# Altium footprint library SMT.PcbLib: 379 footprints (part 20 of 24)
Each footprint in its own frame and in the unit in brackets; x right, y up, seen from the top. Pads: shape width x height; smd on the part's side, far side on the other; paste and mask are expansions set on the pad; w line width, h text height; cw(c..) or ccw(c..) is an arc to the next point about the centre after c.
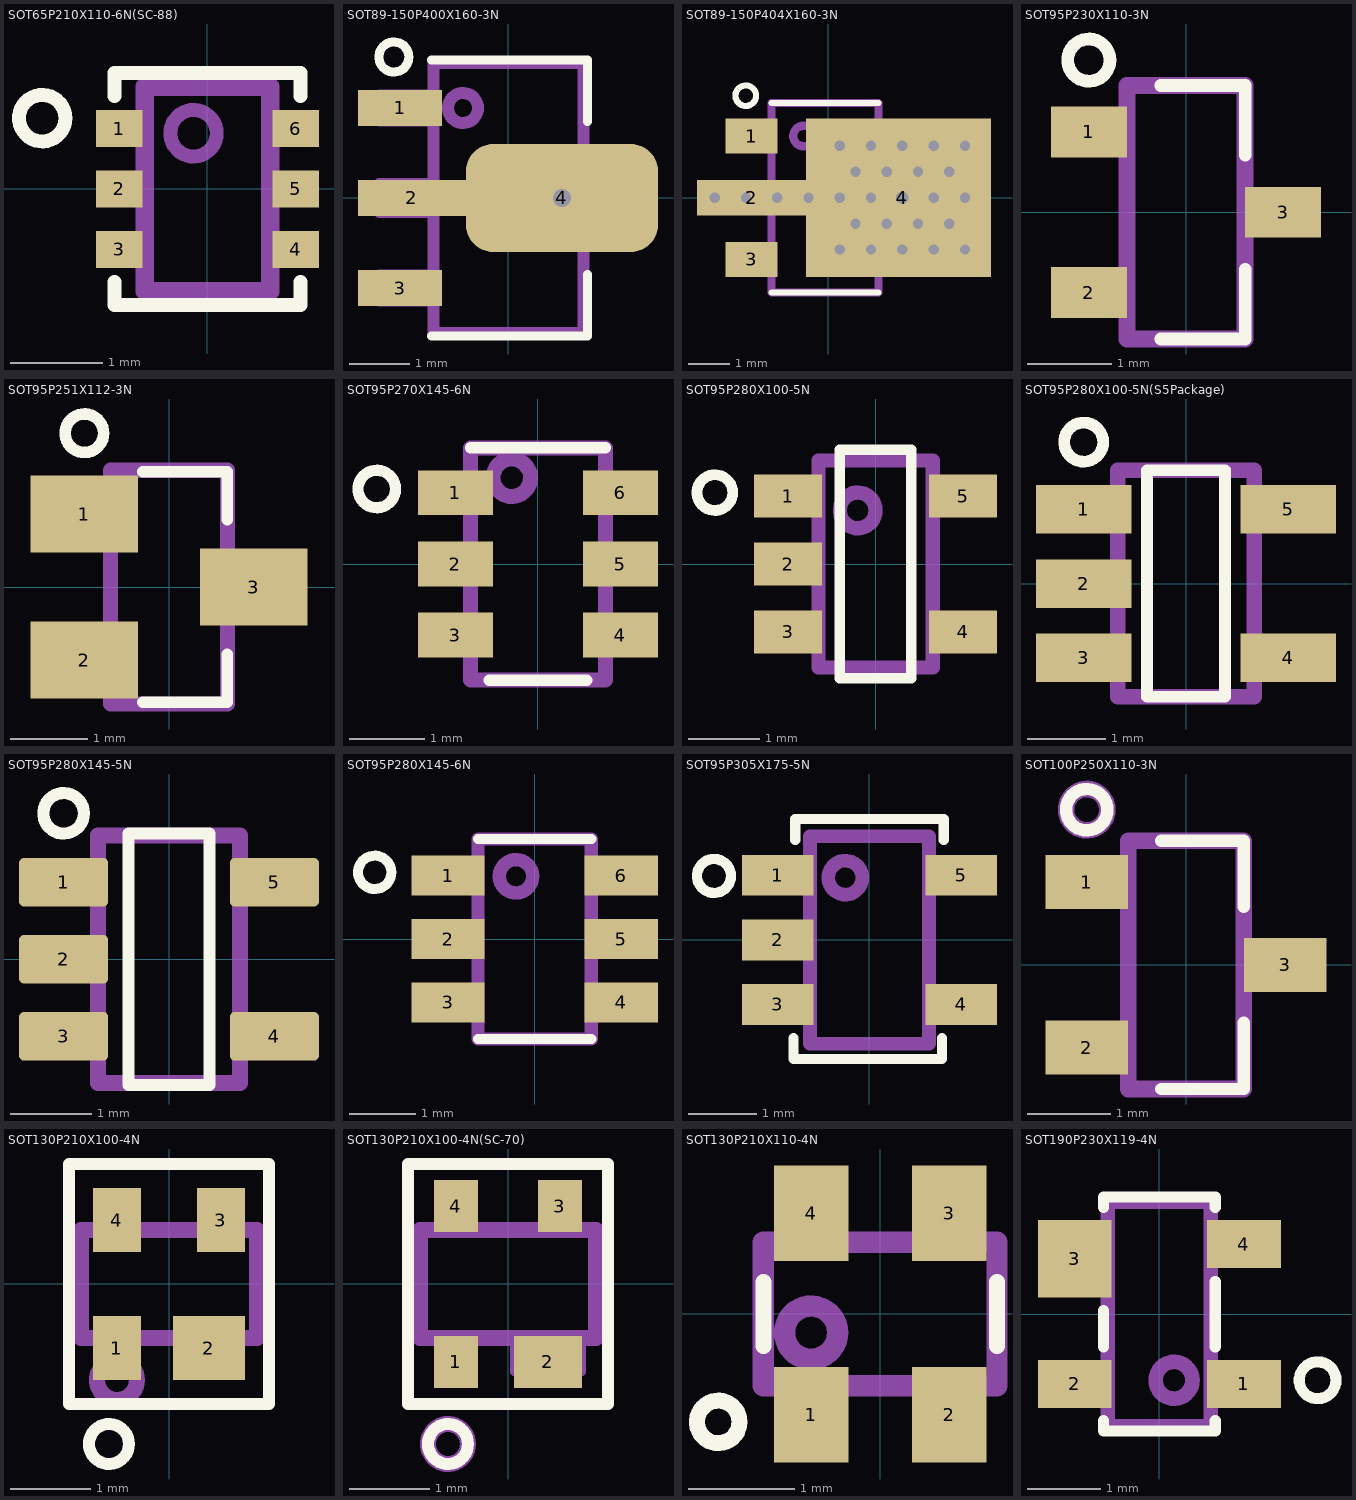
[diagram p19: the footprints below, top view; thin cyan lines are the x and y axes]

## SOT65P210X110-6N(SC-88) [mm] "SOT363, 6-Leads, Body 1,35x2,2x1.10mm (max), Pitch 0,65mm, IPC Medium Density"
height 1.1
pads (6):
  rect 0.5x0.4 smd paste-0.05 mask+0.05: 1(-0.95,0.65) 2(-0.95,0) 3(-0.95,-0.65) 4(0.95,-0.65) 5(0.95,0) 6(0.95,0.65)
Top Overlay:
  circle w0.15: c-1.778,0.762 r0.25
  lines w0.15: -1,-1 -1,-1.25 1,-1.25 1,-1 ; -1,1 -1,1.25 0.75,1.25 1,1.25 1,1
Mechanical 1:
  circle w0.15: c-0.15,0.6 r0.25
  lines w0.2: -0.675,-1.1 0.675,-1.1 0.675,1.1 -0.675,1.1 -0.675,-1.1
3D body "SW3dPS-SW3dPS-SOT363.STEP": height 1.01, standoff 0.02, extent -1.05,-1 1.05,1

## SOT89-150P400X160-3N [mm] "SOT89, 3-Leads, Body 4,50x2,50mm, Pitch 1,50mm, Lead Span 4,0mm, IPC Medium Density"
height 1.6
pads (4):
  rect 1.4x0.6 smd: 1(-1.8,1.5) 3(-1.8,-1.5)
  rect 1.8x0.6 smd: 2(-1.6,0)
  rrect50% 3.2x1.8 hole 0.3: 4(0.9,0)
Top Overlay:
  circle w0.15: c-1.903,2.35 r0.25
  lines w0.15: -1.278,-2.3 1.322,-2.3 1.322,-1.275 ; -1.278,2.3 1.322,2.3 1.322,1.275
Top Paste:
  rectangle: 0.8,-0.5 1.8,0.5
Mechanical 1:
  circle w0.2: c-0.75,1.5 r0.25
  circle w0.2: c-0.75,1.5 r0.25
  lines w0.2: -1.24,-1.708 -2.14,-1.708 -2.14,-1.293 -1.24,-1.293 ; -1.24,-0.233 -2.14,-0.233 -2.14,0.232 -1.24,0.232 ; -1.24,1.292 -2.14,1.292 -2.14,1.707 -1.24,1.707 ; 1.26,-0.801 1.86,-0.801 1.86,0.799 1.26,0.799 ; -1.24,-2.251 -1.24,2.249 1.26,2.249 1.26,-2.251 -1.24,-2.251
Mechanical 20:
  text "Необходима прошивка, см. pdf" at -2.9,3 h1.2
3D body "SOT89.STEP": height 1.5, standoff -0.05, extent -2.125,-2.25 1.875,2.25

## SOT89-150P404X160-3N [mm] "SOT89, 3-Leads, Body 4,49x2,45mm, Pitch 1,50mm, Lead Span 4,0mm, IPC Medium Density"
height 1.6
pads (4):
  rect 1.27x0.86 smd: 1(-1.865,1.5) 3(-1.865,-1.5)
  rect 2.65x0.86 smd paste-10: 2(-1.865,0)
  rect 4.5x3.86 hole 0.3 copper offset -0.09,0: 4(1.8,0)
via -2.76,0 diameter 0.6 hole 0.25
via 3.32,0 diameter 0.6 hole 0.25
via 2.56,0 diameter 0.6 hole 0.25
via 1.04,0 diameter 0.6 hole 0.25
via 0.28,0 diameter 0.6 hole 0.25
via -0.48,0 diameter 0.6 hole 0.25
via -1.24,0 diameter 0.6 hole 0.25
via -2,0 diameter 0.6 hole 0.25
via 3.32,-1.26 diameter 0.6 hole 0.25
via 2.56,-1.26 diameter 0.6 hole 0.25
via 1.8,-1.26 diameter 0.6 hole 0.25
via 1.04,-1.26 diameter 0.6 hole 0.25
via 0.28,-1.26 diameter 0.6 hole 0.25
via 2.94,-0.63 diameter 0.6 hole 0.25
via 2.18,-0.63 diameter 0.6 hole 0.25
via 1.42,-0.63 diameter 0.6 hole 0.25
via 0.66,-0.63 diameter 0.6 hole 0.25
via 0.66,0.63 diameter 0.6 hole 0.25
via 1.42,0.63 diameter 0.6 hole 0.25
via 2.18,0.63 diameter 0.6 hole 0.25
via 2.94,0.63 diameter 0.6 hole 0.25
via 0.28,1.26 diameter 0.6 hole 0.25
via 1.04,1.26 diameter 0.6 hole 0.25
via 1.8,1.26 diameter 0.6 hole 0.25
via 2.56,1.26 diameter 0.6 hole 0.25
via 3.32,1.26 diameter 0.6 hole 0.25
Top Overlay:
  circle w0.15: c-2.005,2.48 r0.25
  lines w0.15: -1.38,-2.3 1.22,-2.3 1.22,-2.305 ; -1.38,2.3 1.22,2.3 1.22,2.305
Top Paste:
  rectangle: -2.5,-0.4 -0.6,0.4
  region: 1,1 2.25,1 2.25,-1 1,-1
Top Solder:
  region: -0.5,0.6 0,1.1 2.3,1.1 2.3,-1.1 0,-1.1 -0.5,-0.6
  region: -0.6,2 -0.6,1.225 2.4,1.225 2.4,-1.225 -0.6,-1.225 -0.6,-2 4.1,-2 4.1,2
Mechanical 1:
  circle w0.2: c-0.6,1.5 r0.25
  lines w0.2: 1.22,-0.81 1.85,-0.81 1.85,0.81 1.22,0.81 ; -1.38,-2.3 1.22,-2.3 1.22,2.3 -1.38,2.3 -1.38,-2.3
3D body "SOT89-150P404X160-3N.step": height 1.6, standoff 0, extent -2.2,-2.3 1.85,2.3

## SOT95P230X110-3N [mm] "SOT23, 3-Leads, Body 2,90x2,30mm, Pitch 0,95mm, IPC Medium Density"
height 1.1
pads (3):
  rect 0.9x0.6 smd: 1(-1.15,0.95) 2(-1.15,-0.95) 3(1.15,0)
Top Overlay:
  circle w0.15: c-1.15,1.8 r0.25
  lines w0.15: -0.3,-1.5 0.7,-1.5 0.7,-0.675 ; -0.3,1.5 0.7,1.5 0.7,0.675
Mechanical 1:
  lines w0.2: -1.2,0.975 -0.725,0.975 ; -1.175,-0.925 -0.7,-0.925 ; 0.7,0 1.15,0 ; -0.7,-1.5 0.7,-1.5 0.7,1.5 -0.7,1.5 -0.7,-1.5
3D body "SOT23.STEP": height 1, standoff 0, extent -1.15,-1.45 1.15,1.45

## SOT95P251X112-3N [mm] "SOT23, 3-Leads, Body 2,92x2,51mm, Pitch 0,95mm, IPC Medium Density"
height 1.12
pads (3):
  rect 1.4x1 smd: 1(-1.1,0.95) 2(-1.1,-0.95) 3(1.1,0)
Top Overlay:
  circle w0.15: c-1.1,2 r0.25
  lines w0.15: -0.34,-1.5 0.76,-1.5 0.76,-0.875 ; -0.34,1.5 0.76,1.5 0.76,0.875
Mechanical 1:
  lines w0.2: -0.76,-1.52 -0.76,1.52 0.76,1.52 0.76,-1.52 -0.76,-1.52
3D body "SOT95P251X112-3N.step": height 1.12, standoff 0, extent -1.355,-1.52 1.355,1.52

## SOT95P270X145-6N [mm] "SOT23, 6-Leads, Body 2,90x2,70mm, Pitch 0,95mm, IPC Medium Density"
height 1.45
pads (6):
  rect 1x0.6 smd: 1(-1.1,0.95) 2(-1.1,0) 3(-1.1,-0.95) 4(1.1,-0.95) 5(1.1,0) 6(1.1,0.95)
Top Overlay:
  circle w0.15: c-2.15,1 r0.25
  lines w0.15: -0.9,1.55 0.9,1.55 ; -0.65,-1.55 0.65,-1.55
Mechanical 1:
  lines w0.2: -0.11,1.219 ccw(c-0.35,1.15) -0.1,1.15 ; -0.9,-1.55 -0.9,1.55 0.9,1.55 0.9,-1.55 -0.9,-1.55
3D body "SOT23-6_AND_SOT26.STEP": height 1.02, standoff 0.02, extent -1.375,-1.45 1.375,1.45

## SOT95P280X100-5N [mm] "SOT23, 5-Leads, Body 2,90x2,80mm, Pitch 0,95mm, IPC Medium Density"
height 1
pads (5):
  rect 0.95x0.6 smd: 1(-1.225,0.95) 2(-1.225,0) 3(-1.225,-0.95) 4(1.225,-0.95) 5(1.225,0.95)
Top Overlay:
  circle w0.15: c-2.25,1 r0.25
  lines w0.15: -0.5,-1.6 -0.5,1.6 0.5,1.6 0.5,-1.6 -0.5,-1.6
Mechanical 1:
  circle w0.2: c-0.25,0.75 r0.25
  lines w0.2: -0.8,-1.45 0.8,-1.45 0.8,1.45 -0.8,1.45 -0.8,-1.45
3D body "SOT23-5_AND_SOT25.STEP": height 1.01, standoff 0.01, extent -1.375,-1.45 1.375,1.45

## SOT95P280X100-5N(S5Package) [mm] "SOT23, 5-Leads, Body 2,90x2,80mm, Pitch 0,95mm, IPC Medium Density"
height 1
pads (5):
  rect 1.22x0.62 smd: 1(-1.31,0.95) 2(-1.31,0) 3(-1.31,-0.95) 4(1.31,-0.95) 5(1.31,0.95)
Top Overlay:
  circle w0.15: c-1.31,1.81 r0.25
  lines w0.15: -0.5,-1.45 0.5,-1.45 0.5,1.45 -0.5,1.45 -0.5,-1.45
Mechanical 1:
  lines w0.2: -0.875,-1.45 -0.875,1.45 0.875,1.45 0.875,-1.45 -0.875,-1.45
3D body "SOT95P280X100-5N(S5Package).step": height 1, standoff 0, extent -1.4,-1.45 1.4,1.45

## SOT95P280X145-5N [mm] "SOT23, 5-Leads, Body 2,90x2,80mm, Pitch 0,95mm, IPC Medium Density"
height 1.45
pads (5):
  rrect20% 1.1x0.6 smd paste+0 mask+0.05: 1(-1.3,0.95) 2(-1.3,0) 3(-1.3,-0.95) 4(1.3,-0.95) 5(1.3,0.95)
Top Overlay:
  circle w0.15: c-1.3,1.8 r0.25
  lines w0.15: -0.5,-1.55 -0.5,1.55 0.5,1.55 0.5,-1.55 -0.5,-1.55
Mechanical 1:
  lines w0.2: -0.875,-1.525 0.875,-1.525 0.875,1.525 -0.875,1.525 -0.875,-1.525
3D body "SOT95P280X145-5N.step": height 1.45, standoff 0, extent -1.5,-1.525 1.5,1.525

## SOT95P280X145-6N [mm] "SOT23, 6-Leads, Body 1,6x2,9mm, Pitch 0,95mm"
height 1.45
pads (6):
  rect 1.1x0.6 smd: 1(-1.3,0.95) 2(-1.3,0) 3(-1.3,-0.95) 4(1.3,-0.95) 5(1.3,0) 6(1.3,0.95)
Top Overlay:
  circle w0.15: c-2.4,1 r0.25
  lines w0.15: -0.85,-1.5 0.85,-1.5 ; -0.85,1.5 0.85,1.5
Mechanical 1:
  circle w0.2: c-0.28,0.94 r0.25
  lines w0.2: -0.85,-1.5 -0.85,1.5 0.85,1.5 0.85,-1.5 -0.85,-1.5
3D body "Микросхема ADT6401.stp": height 1.45, standoff 0, extent -1.45,-1.5 1.45,1.5

## SOT95P305X175-5N [mm] "SOT23, 5-Leads, Body 3.05x1.75mm, Pitch 0,95mm, IPC Medium Density"
height 1.45
pads (5):
  rect 1.05x0.6 smd: 1(-1.35,0.95) 2(-1.35,0) 3(-1.35,-0.95) 4(1.35,-0.95) 5(1.35,0.95)
Top Overlay:
  circle w0.15: c-2.286,0.94 r0.25
  lines w0.15: -1.118,-1.448 -1.118,-1.753 1.067,-1.753 1.067,-1.448 ; -1.092,1.473 -1.092,1.778 1.092,1.778 1.092,1.473
Mechanical 1:
  circle w0.2: c-0.356,0.914 r0.25
  lines w0.2: -0.875,-1.525 0.875,-1.525 0.875,1.525 -0.875,1.525 -0.875,-1.525
3D body "User Library-SOT23-5-2.STEP": height 1.45, standoff 0, extent -1.4,-1.45 1.4,1.45

## SOT100P250X110-3N [mm] "SOT23, 3-Leads, Body 3,00x2,50mm, Pitch 1,00mm, IPC Medium Density"
height 1.1
pads (3):
  rect 1x0.65 smd: 1(-1.2,1) 2(-1.2,-1) 3(1.2,0)
Top Overlay:
  circle w0.15: c-1.2,1.875 r0.25
  lines w0.15: -0.3,-1.5 0.7,-1.5 0.7,-0.7 ; -0.3,1.5 0.7,1.5 0.7,0.7
Mechanical 1:
  circle w0.2: c-1.2,1.875 r0.25
  lines w0.2: -0.7,-1.5 0.7,-1.5 0.7,1.5 -0.7,1.5 -0.7,-1.5
3D body "SOT100P250X110-3N.step": height 1.1, standoff 0, extent -1.25,-1.5 1.25,1.5

## SOT130P210X100-4N [mm] "SOT343, 4-Leads, Body 2,00x2,10mm, Pitch 1,30mm, IPC Medium Density"
height 1
pads (4):
  rect 0.6x0.8 smd: 1(-0.65,-0.8) 3(0.65,0.8) 4(-0.65,0.8)
  rect 0.9x0.8 smd: 2(0.5,-0.8)
Top Overlay:
  circle w0.15: c-0.75,-2 r0.25
  lines w0.15: -1.25,-1.5 -1.25,1.5 1.25,1.5 1.25,-1.5 -1.25,-1.5
Mechanical 1:
  circle w0.2: c-0.65,-1.2 r0.25
  lines w0.2: -1.1,-0.675 1.1,-0.675 1.1,0.675 -1.1,0.675 -1.1,-0.675
3D body "SOT343R.STEP": height 0.96, standoff 0.01, extent -1,-1.05 1,1.05

## SOT130P210X100-4N(SC-70) [mm] "SOT343, 4-Leads, Body 2,00x2,10mm, Pitch 1,30mm, IPC Medium Density"
height 1
pads (4):
  rect 0.55x0.65 smd: 1(-0.65,-0.975) 3(0.65,0.975) 4(-0.65,0.975)
  rect 0.85x0.65 smd: 2(0.5,-0.975)
Top Overlay:
  circle w0.15: c-0.75,-2 r0.25
  lines w0.15: -1.25,-1.5 1.25,-1.5 1.25,1.5 -1.25,1.5 -1.25,-1.5
Mechanical 1:
  circle w0.2: c-0.75,-2 r0.25
  lines w0.1: -0.85,-0.675 -0.85,-1.1 -0.45,-1.1 -0.45,-0.675 ; -0.85,0.675 -0.85,1.1 -0.45,1.1 -0.45,0.675 ; 0.075,-0.675 0.075,-1.1 0.925,-1.1 0.925,-0.675 ; 0.45,0.675 0.45,1.1 0.85,1.1 0.85,0.675
  lines w0.2: -1.1,-0.675 -1.1,0.675 1.1,0.675 1.1,-0.675 -1.1,-0.675
3D body "SOT343R.STEP": height 0.96, standoff 0.01, extent -1,-1.05 1,1.05

## SOT130P210X110-4N [mm] "SOT143, 4-Leads, Body 2,00x2,10mm, Pitch 1,30mm, IPC Medium Density"
height 1.1
pads (4):
  rect 0.7x0.9 smd: 1(-0.65,-0.95) 2(0.65,-0.95) 3(0.65,0.95) 4(-0.65,0.95)
Top Overlay:
  circle w0.15: c-1.524,-1.016 r0.2
  lines w0.15: -1.1,-0.3 -1.1,0.3 ; 1.1,-0.3 1.1,0.3
Mechanical 1:
  circle w0.2: c-0.65,-0.175 r0.25
  lines w0.2: -1.1,-0.675 -1.1,0.675 1.1,0.675 1.1,-0.675 -1.1,-0.675
3D body "SOT130P210X110-4N.step": height 1.1, standoff 0, extent -1.1,-1.25 1.1,1.25

## SOT190P230X119-4N [mm] "SOT143, 4-Leads, Body 2,86x2,38mm, Pitch 1,90mm, IPC Medium Density"
height 1.19
pads (4):
  rect 1x0.65 smd: 1(1.15,-0.95) 2(-1.15,-0.95) 4(1.15,0.95)
  rect 1x1.05 smd: 3(-1.15,0.75)
Top Overlay:
  circle w0.15: c2.15,-0.9 r0.25
  lines w0.15: -0.76,-1.45 -0.76,-1.59 0.76,-1.59 0.76,-1.45 ; -0.76,-0.45 -0.76,0.05 ; -0.76,1.45 -0.76,1.59 0.76,1.59 0.76,1.45 ; 0.76,-0.45 0.76,0.44
Mechanical 1:
  circle w0.2: c0.2,-0.9 r0.25
  lines w0.2: -0.7,-1.525 0.7,-1.525 0.7,1.525 -0.7,1.525 -0.7,-1.525
3D body "SOT143B.STEP": height 1, standoff 0, extent -1.14,-1.45 1.16,1.45